# Altium footprint library LimeMicroAltiumLib_pcbLib.PcbLib: 274 footprints (part 1 of 18)
Each footprint in its own frame and in the unit in brackets; x right, y up, seen from the top. Pads: shape width x height; smd on the part's side, far side on the other; paste and mask are expansions set on the pad; w line width, h text height; cw(c..) or ccw(c..) is an arc to the next point about the centre after c.
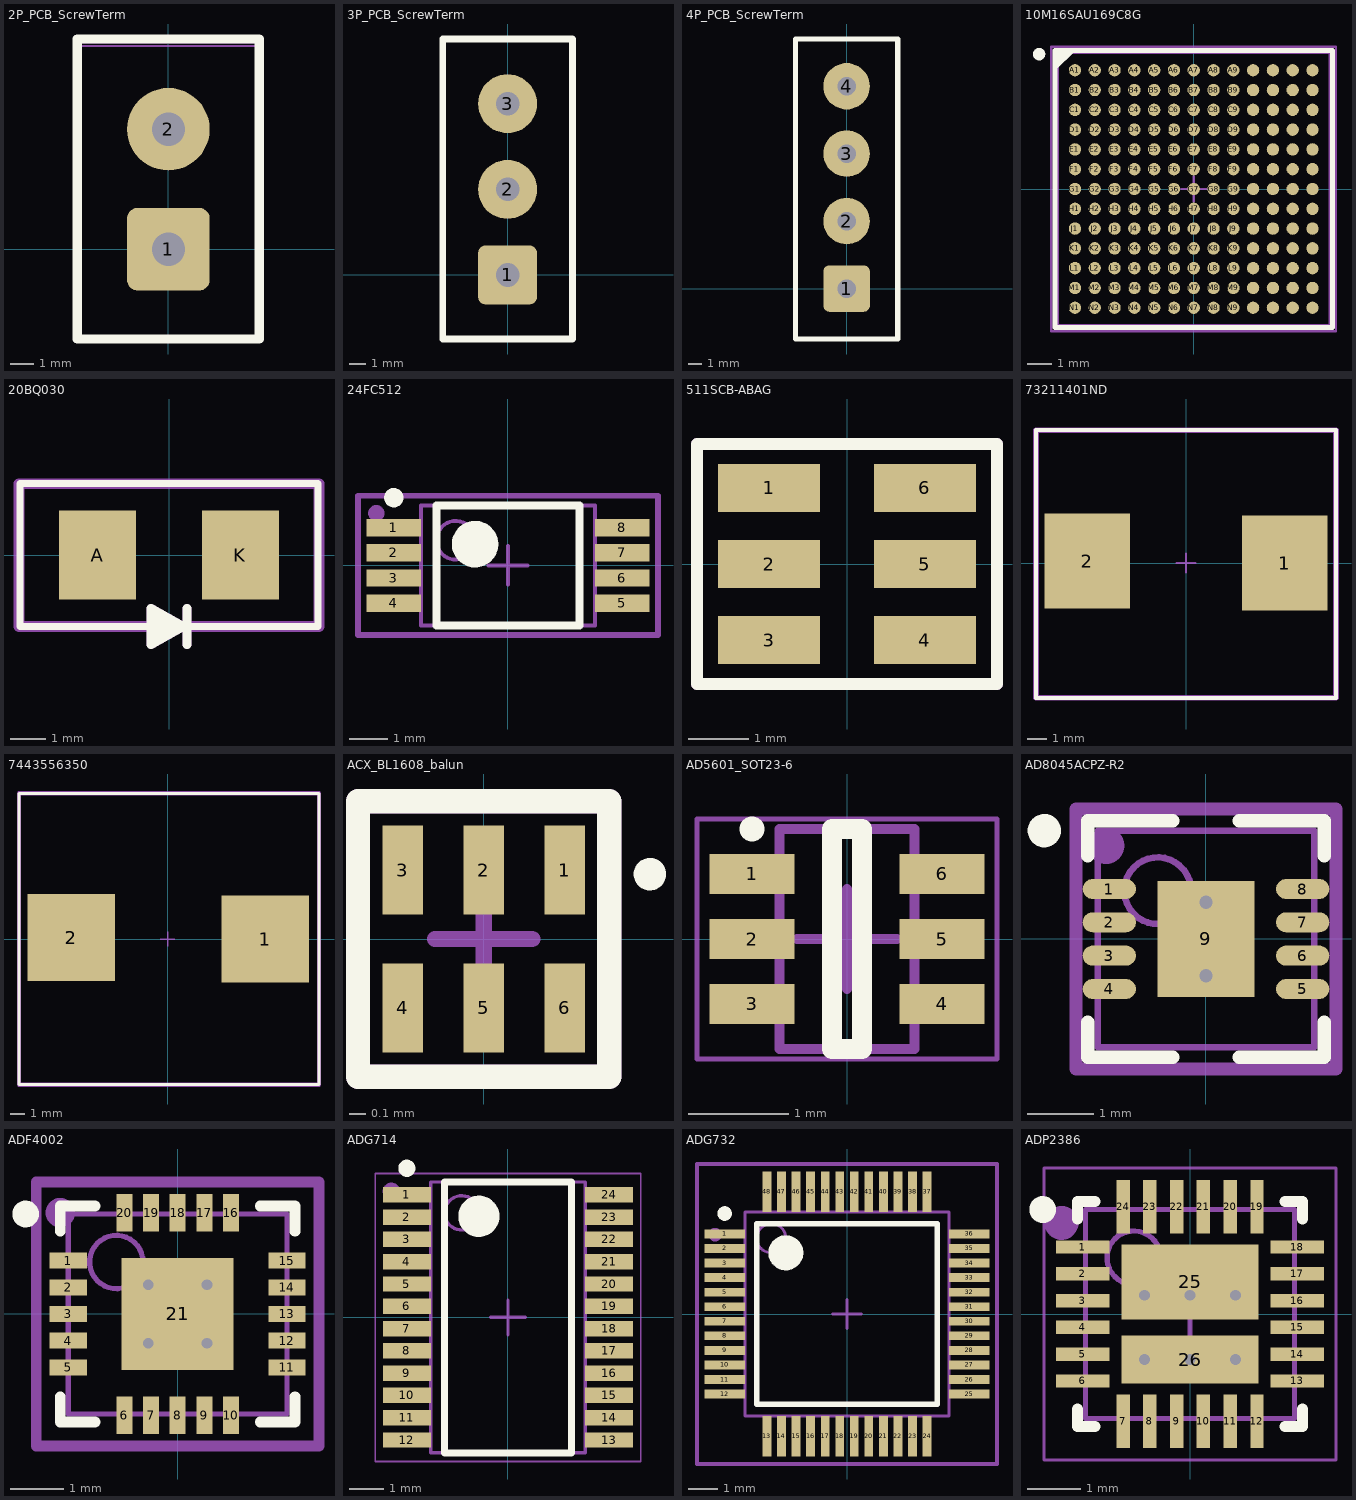
[diagram p0: the footprints below, top view; thin cyan lines are the x and y axes]

## 2P_PCB_ScrewTerm [mm] "TERM BLOCK 2POS SIDE"
height 8.5
pads (2):
  rrect25% 3.5x3.5 hole 1.4: 1(0,0)
  round 3.5 hole 1.4: 2(0,5.08)
Top Overlay:
  lines w0.4: -3.85,-3.8 3.85,-3.8 3.85,8.9 -3.85,8.9 -3.85,-3.8
Mechanical 13:
  lines w0.076: -3.85,-3.8 3.8,-3.8 3.8,8.6 -3.85,8.6 -3.85,-3.8
Mechanical 15:
  lines w0.2: 3.4,-3.8 -3.8,-3.8 -3.8,8.8 3.9,8.8 3.9,-3.8
  text ".designator" at -0.1,2.5 h1.2
3D body "terminal_blocks_a-tb500vj02h.stp": height 19, standoff -4, extent -5.503,-3.098 5,8.098

## 3P_PCB_ScrewTerm [mm] "TERM BLOCK 3POS SIDE"
height 8.5
pads (3):
  rrect25% 3.5x3.5 hole 1.4: 1(0,0)
  round 3.5 hole 1.4: 2(0,5.08) 3(0,10.16)
Top Overlay:
  lines w0.4: -3.85,-3.8 3.85,-3.8 3.85,14 -3.85,14 -3.85,-3.8
Mechanical 13:
  lines w0.076: -3.85,-3.8 3.8,-3.8 3.8,14 -3.85,14 -3.85,-3.8
Mechanical 15:
  lines w0.2: -3.4,13.96 3.8,13.96 ; 3.4,-3.8 -3.8,-3.8 -3.8,14 3.9,14 3.9,-3.8
  text ".designator" at -0.1,2.5 h1.2
3D body "terminal_blocks_a-tb500vj02h.stp": height 19, standoff -4, extent -5.503,1.982 5,13.178
3D body "terminal_blocks_a-tb500vj02h.stp": height 19, standoff -4, extent -5.503,-3.098 5,8.098

## 4P_PCB_ScrewTerm [mm] "TERM BLOCK 10POS SIDE ENT 3.81MM"
height 8.5
pads (4):
  rrect25% 3.5x3.5 hole 1.4: 1(0,0)
  round 3.5 hole 1.4: 2(0,5.08) 3(0,10.16) 4(0,15.24)
Top Overlay:
  lines w0.4: -3.85,-3.8 3.85,-3.8 3.85,18.8 -3.85,18.8 -3.85,-3.8
Mechanical 13:
  lines w0.076: -3.85,-3.8 3.8,-3.8 3.8,18.8 -3.85,18.8 -3.85,-3.8
Mechanical 15:
  lines w0.2: 3.4,-3.8 -3.8,-3.8 -3.8,18.8 3.9,18.8 3.9,-3.8
  text ".designator" at -0.1,7.6 h1.2
3D body "terminal_blocks_a-tb500vj02h.stp": height 19, standoff -4, extent -5.503,-2.998 5,8.198
3D body "terminal_blocks_a-tb500vj02h.stp": height 19, standoff -4, extent -5.503,6.962 5,18.158

## 10M16SAU169C8G [mm] "BGA, 169-Leads, Body 11,00x11,00mmx1,55mm, Pitch 0,80mm"
height 1.55
pads (169):
  round 0.5 smd mask+0.02: A1(-4.8,4.8) A2(-4,4.8) A3(-3.2,4.8) A4(-2.4,4.8) A5(-1.6,4.8) A6(-0.8,4.8) A7(0,4.8) A8(0.8,4.8) A9(1.6,4.8) A10(2.4,4.8) A11(3.2,4.8) A12(4,4.8) A13(4.8,4.8) B1(-4.8,4) B2(-4,4) B3(-3.2,4) B4(-2.4,4) B5(-1.6,4) B6(-0.8,4) B7(0,4) B8(0.8,4) B9(1.6,4) B10(2.4,4) B11(3.2,4) B12(4,4) B13(4.8,4) C1(-4.8,3.2) C2(-4,3.2) C3(-3.2,3.2) C4(-2.4,3.2) C5(-1.6,3.2) C6(-0.8,3.2) C7(0,3.2) C8(0.8,3.2) C9(1.6,3.2) C10(2.4,3.2) C11(3.2,3.2) C12(4,3.2) C13(4.8,3.2) D1(-4.8,2.4) D2(-4,2.4) D3(-3.2,2.4) D4(-2.4,2.4) D5(-1.6,2.4) D6(-0.8,2.4) D7(0,2.4) D8(0.8,2.4) D9(1.6,2.4) D10(2.4,2.4) D11(3.2,2.4) D12(4,2.4) D13(4.8,2.4) E1(-4.8,1.6) E2(-4,1.6) E3(-3.2,1.6) E4(-2.4,1.6) E5(-1.6,1.6) E6(-0.8,1.6) E7(0,1.6) E8(0.8,1.6) E9(1.6,1.6) E10(2.4,1.6) E11(3.2,1.6) E12(4,1.6) E13(4.8,1.6) F1(-4.8,0.8) F2(-4,0.8) F3(-3.2,0.8) F4(-2.4,0.8) F5(-1.6,0.8) F6(-0.8,0.8) F7(0,0.8) F8(0.8,0.8) F9(1.6,0.8) F10(2.4,0.8) F11(3.2,0.8) F12(4,0.8) F13(4.8,0.8) G1(-4.8,0) G2(-4,0) G3(-3.2,0) G4(-2.4,0) G5(-1.6,0) G6(-0.8,0) G7(0,0) G8(0.8,0) G9(1.6,0) G10(2.4,0) G11(3.2,0) G12(4,0) G13(4.8,0) H1(-4.8,-0.8) H2(-4,-0.8) H3(-3.2,-0.8) H4(-2.4,-0.8) H5(-1.6,-0.8) H6(-0.8,-0.8) H7(0,-0.8) H8(0.8,-0.8) H9(1.6,-0.8) H10(2.4,-0.8) H11(3.2,-0.8) H12(4,-0.8) H13(4.8,-0.8) J1(-4.8,-1.6) J2(-4,-1.6) J3(-3.2,-1.6) J4(-2.4,-1.6) J5(-1.6,-1.6) J6(-0.8,-1.6) J7(0,-1.6) J8(0.8,-1.6) J9(1.6,-1.6) J10(2.4,-1.6) J11(3.2,-1.6) J12(4,-1.6) J13(4.8,-1.6) K1(-4.8,-2.4) K2(-4,-2.4) K3(-3.2,-2.4) K4(-2.4,-2.4) K5(-1.6,-2.4) K6(-0.8,-2.4) K7(0,-2.4) K8(0.8,-2.4) K9(1.6,-2.4) K10(2.4,-2.4) K11(3.2,-2.4) K12(4,-2.4) K13(4.8,-2.4) L1(-4.8,-3.2) L2(-4,-3.2) L3(-3.2,-3.2) L4(-2.4,-3.2) L5(-1.6,-3.2) L6(-0.8,-3.2) L7(0,-3.2) L8(0.8,-3.2) L9(1.6,-3.2) L10(2.4,-3.2) L11(3.2,-3.2) L12(4,-3.2) L13(4.8,-3.2) M1(-4.8,-4) M2(-4,-4) M3(-3.2,-4) M4(-2.4,-4) M5(-1.6,-4) M6(-0.8,-4) M7(0,-4) M8(0.8,-4) M9(1.6,-4) M10(2.4,-4) M11(3.2,-4) M12(4,-4) M13(4.8,-4) N1(-4.8,-4.8) N2(-4,-4.8) N3(-3.2,-4.8) N4(-2.4,-4.8) N5(-1.6,-4.8) N6(-0.8,-4.8) N7(0,-4.8) N8(0.8,-4.8) N9(1.6,-4.8) N10(2.4,-4.8) N11(3.2,-4.8) N12(4,-4.8) N13(4.8,-4.8)
Top Overlay:
  circle w0.25: c-6.25,5.45 r0.125
  region: -4.919,5.6 -5.6,4.919 -5.6,5.6
  lines w0.2: -5.6,4.919 -4.919,5.6 ; -5.6,-5.6 5.6,-5.6 5.6,5.6 -5.6,5.6 -5.6,-5.6
Mechanical 13:
  lines w0.1: -5.5,-5.5 5.5,-5.5 5.5,5.5 -5.5,5.5 -5.5,-5.5
Mechanical 15:
  circle w0.2: c-4.8,4.8 r0.1
  lines w0.1: -0.5,0 0.5,0 ; 0,-0.5 0,0.5 ; -5.75,-5.75 5.75,-5.75 5.75,5.75 -5.75,5.75 -5.75,-5.75
  text ".Designator" at 0,0 h0.55
3D body: height 1.65, standoff 1.55, extent -5.2,4.4 -4.4,5.2
3D body: height 1.55, standoff 0, extent -5.5,-5.5 5.5,5.5

## 20BQ030 [mm]
pads (2):
  rect 2.15x2.5 smd: A(-2,0) K(2,0)
Top Overlay:
  lines w0.2: -4.175,-2 4.175,-2 4.175,2 -4.175,2 -4.175,0 -4.175,-2
  lines w0.254: -0.5,-2.2 -0.1,-2.2 ; -0.5,-2 -0.3,-2 0.4,-2 ; -0.5,-1.8 0,-1.8 ; 0.5,-2.5 0.5,-1.5 ; 0.4,-2 -0.5,-2.5 -0.5,-1.5 0.4,-2
Mechanical 15:
  lines w0.254: -0.5,-2.2 -0.1,-2.2 ; -0.5,-2 -0.3,-2 0.4,-2 ; -0.5,-1.8 0,-1.8 ; 0.5,-2.5 0.5,-1.5 ; 0.4,-2 -0.5,-1.5 -0.5,-2.5 0.4,-2
  lines w0.3: -4.2,-2 4.2,-2 4.2,2 -4.2,2 -4.2,-2
  text ".Designator" at 0,0 h0.7

## 24FC512 [mm] "TSOP, 8-Leads, Body 3,00x4,40mm, Pitch 0,65mm, IPC Medium Density"
height 1.2
pads (8):
  rect 1.4x0.45 smd mask+0.05: 1(-2.95,0.975) 2(-2.95,0.325) 3(-2.95,-0.325) 4(-2.95,-0.975) 5(2.95,-0.975) 6(2.95,-0.325) 7(2.95,0.325) 8(2.95,0.975)
Top Overlay:
  circle w0.6: c-0.85,0.55 r0.3
  circle w0.25: c-2.95,1.75 r0.125
  lines w0.2: -1.85,-1.55 1.85,-1.55 1.85,1.55 -1.85,1.55 -1.85,-1.55
Mechanical 13:
  circle w0.1: c-1.35,0.65 r0.5
  lines w0.1: -2.25,-1.55 2.25,-1.55 2.25,1.55 -2.25,1.55 -2.25,-1.55
Mechanical 15:
  circle w0.35: c-3.4,1.35 r0.035
  lines w0.1: -0.5,0 0.5,0 ; 0,-0.5 0,0.5
  lines w0.15: -3.875,-1.8 3.875,-1.8 3.875,1.8 -3.875,1.8 -3.875,-1.8
  text ".Designator" at 0,0 h0.7
3D body "TSSOP-8.STEP": height 1.19, standoff -0.01, extent -3.25,-1.55 3.25,1.55

## 511SCB-ABAG [mm]
pads (6):
  rect 1.7x0.8 smd: 1(-1.3,1.27) 2(-1.3,0) 3(-1.3,-1.27) 4(1.3,-1.27) 5(1.3,0) 6(1.3,1.27)
Top Overlay:
  lines w0.2: -2.5,-2 -2.5,2 2.5,2 2.5,-2 -2.5,-2
Mechanical 15:
  lines w0.2: -2.5,-2 -2.5,2 2.5,2 2.5,-2 -2.5,-2
  text ".designator" at 0,0 h0.7
3D body: height 1, standoff 0, extent -1.75,-1.8 1.75,1.8

## 73211401ND [mm]
pads (2):
  rect 4.5x5 smd: 1(5.2,0) 2(-5.2,0.1)
Top Overlay:
  lines w0.2: -7.9,-7.1 -7.9,7 7.9,7 7.9,-7.1 -7.9,-7.1
Mechanical 15:
  lines w0.1: -0.5,0 0.5,0 ; 0,-0.5 0,0.5
  lines w0.3: -7.9,-7.1 -7.9,7 7.9,7 7.9,-7.1 -7.9,-7.1
  text ".Designator" at 0,0 h0.7
3D body: height 6.5, standoff 0, extent -6.4,-6.4 6.4,6.4

## 7443556350 [mm]
pads (2):
  rect 6x6 smd: 1(6.7,0) 2(-6.6,0.1)
Top Overlay:
  lines w0.2: -10.2,-10 10.4,-10 10.4,10 -10.2,10 -10.2,-10
Mechanical 15:
  lines w0.1: -0.5,0 0.5,0 ; 0,-0.5 0,0.5
  lines w0.3: -10.2,-10 10.4,-10 10.4,10 -10.2,10 -10.2,-10
  text ".Designator" at 0,0 h0.7
3D body: height 9, standoff 0, extent -9.1,-9.1 9.1,9.1

## ACX_BL1608_balun [mm]
pads (6):
  rect 0.25x0.55 smd mask+0.05: 1(0.5,0.425) 2(0,0.425) 3(-0.5,0.425) 4(-0.5,-0.425) 5(0,-0.425) 6(0.5,-0.425)
Top Overlay:
  circle w0.1: c1.025,0.4 r0.05
  lines w0.15: -0.775,-0.85 -0.775,0.85 0.775,0.85 0.775,-0.85 -0.775,-0.85
Mechanical 15:
  circle w0.1: c0.5,0.475 r0.05
  lines w0.1: -0.3,0 0,0 ; 0,-0.3 0,0 ; 0,0.3 0,0 ; 0.3,0 0,0
  lines w0.15: -0.775,-0.85 0.775,-0.85 0.775,0.85 -0.775,0.85 -0.775,-0.85
  text ".Designator" at 0,0 h0.55
3D body: height 0.6, standoff 0, extent -0.8,-0.4 0.8,0.4
3D body: height 0.6, standoff 0, extent -0.6,-0.425 -0.4,-0.275
3D body: height 0.6, standoff 0, extent -0.1,-0.425 0.1,-0.275
3D body: height 0.6, standoff 0, extent 0.4,-0.425 0.6,-0.275
3D body: height 0.6, standoff 0, extent 0.4,0.275 0.6,0.425
3D body: height 0.6, standoff 0, extent -0.1,0.275 0.1,0.425
3D body: height 0.6, standoff 0, extent -0.6,0.275 -0.4,0.425
3D body: height 0.6, standoff 0, extent 0.4,-0.075 0.6,0.15

## AD5601_SOT23-6 [mm] "SOT23, 6-Leads, Body 2x1.3mm, Pitch 0.65mm, Lead Span 2.1mm, IPC Medium Density"
height 1.1
pads (6):
  rect 0.85x0.4 smd mask+0.05: 1(-0.95,0.65) 2(-0.95,0) 3(-0.95,-0.65) 4(0.95,-0.65) 5(0.95,0) 6(0.95,0.65)
Top Overlay:
  circle w0.25: c-0.95,1.1 r0
  lines w0.2: -0.15,-1.1 -0.15,1.1 0.15,1.1 0.15,-1.1 -0.15,-1.1
Mechanical 13:
  lines w0.1: -0.675,-1.1 0.675,-1.1 0.675,1.1 -0.675,1.1 -0.675,-1.1
Mechanical 15:
  circle w0.15: c-1,0.7 r0.056
  lines w0.05: -1.5,-1.2 1.5,-1.2 1.5,1.2 -1.5,1.2 -1.5,-1.2
  lines w0.1: -0.5,0 0.5,0 ; 0,-0.5 0,0.5
  text ".Designator" at 0,0 h0.55
3D body "User Library-SC70-6.step": height 0.43, standoff -0.53, extent -1.05,-1 1.05,1

## AD8045ACPZ-R2 [mm] "QFN, 8-Leads, Body 3x3mm, Pitch 0.5mm, Thermal Pad 1.45X1.74mm, IPC High Density"
height 0.9
pads (9):
  oval 0.8x0.3 smd mask+0.05: 1(-1.45,0.75) 2(-1.45,0.25) 3(-1.45,-0.25) 4(-1.45,-0.75) 5(1.45,-0.75) 6(1.45,-0.25) 7(1.45,0.25) 8(1.45,0.75)
  rect 1.45x1.74 smd: 9(0,0)
via 0,0.55 diameter 0.5 hole 0.2
via 0,-0.55 diameter 0.5 hole 0.2
Top Overlay:
  circle w0.25: c-2.425,1.625 r0.125
  lines w0.2: -1.775,-1.25 -1.775,-1.775 -0.5,-1.775 ; -1.775,1.25 -1.775,1.775 -0.5,1.775 ; 0.5,-1.775 1.775,-1.775 1.775,-1.25 ; 0.5,1.775 1.775,1.775 1.775,1.25
Mechanical 13:
  circle w0.1: c-0.725,0.725 r0.5
  lines w0.1: -1.625,-1.625 -1.625,1.625 1.625,1.625 1.625,-1.625 -1.625,-1.625
Mechanical 15:
  circle w0.35: c-1.5,1.4 r0.1
  lines w0.1: -0.5,0 0.5,0 ; 0,-0.5 0,0.5
  lines w0.2: -1.95,-1.95 -1.95,1.95 1.95,1.95 1.95,-1.95 -1.95,-1.95
  text ".Designator" at 0,0 h0.7
3D body "User Library-AD8137 lfcsp.step": height 0.9, standoff -0.04, extent -1.476,-1.5 1.526,1.5

## ADF4002 [mm]
height 0.85
pads (21):
  rect 0.7x0.3 smd mask+0.05: 1(-2.05,1) 2(-2.05,0.5) 3(-2.05,0) 4(-2.05,-0.5) 5(-2.05,-1) 11(2.05,-1) 12(2.05,-0.5) 13(2.05,0) 14(2.05,0.5) 15(2.05,1)
  rect 0.3x0.7 smd mask+0.05: 6(-1,-1.9) 7(-0.5,-1.9) 8(0,-1.9) 9(0.5,-1.9) 10(1,-1.9) 16(1,1.9) 17(0.5,1.9) 18(0,1.9) 19(-0.5,1.9) 20(-1,1.9)
  rect 2.1x2.1 smd: 21(0,0)
via -0.55,0.55 diameter 0.5 hole 0.2
via 0.55,0.55 diameter 0.5 hole 0.2
via -0.55,-0.55 diameter 0.5 hole 0.2
via 0.55,-0.55 diameter 0.5 hole 0.2
Top Overlay:
  circle w0.25: c-2.85,1.875 r0.125
  lines w0.2: -2.2,-1.55 -2.2,-2.025 -1.55,-2.025 ; -2.2,1.55 -2.2,2.025 -1.55,2.025 ; 1.55,-2.025 2.2,-2.025 2.2,-1.55 ; 1.55,2.025 2.2,2.025 2.2,1.55
Mechanical 13:
  circle w0.1: c-1.15,0.975 r0.5
  lines w0.1: -2.05,-1.875 -2.05,1.875 2.05,1.875 2.05,-1.875 -2.05,-1.875
Mechanical 15:
  circle w0.35: c-2.2,1.9 r0.1
  lines w0.1: -0.5,0 0.5,0 ; 0,-0.5 0,0.5
  lines w0.2: -2.65,-2.475 -2.65,2.475 2.65,2.475 2.65,-2.475 -2.65,-2.475
  text ".Designator" at 0,0 h0.7
3D body "User Library-QFN4x4_20pins.step": height 0.8, standoff 0, extent -2.025,-2.02 2.015,2.02

## ADG714 [mm] "TSOP, 24-Leads, Body 7,80x4,40mm, Pitch 0,65mm, IPC Medium Density"
height 1.2
pads (24):
  rect 1.4x0.45 smd mask+0.05: 1(-2.95,3.575) 2(-2.95,2.925) 3(-2.95,2.275) 4(-2.95,1.625) 5(-2.95,0.975) 6(-2.95,0.325) 7(-2.95,-0.325) 8(-2.95,-0.975) 9(-2.95,-1.625) 10(-2.95,-2.275) 11(-2.95,-2.925) 12(-2.95,-3.575) 13(2.95,-3.575) 14(2.95,-2.925) 15(2.95,-2.275) 16(2.95,-1.625) 17(2.95,-0.975) 18(2.95,-0.325) 19(2.95,0.325) 20(2.95,0.975) 21(2.95,1.625) 22(2.95,2.275) 23(2.95,2.925) 24(2.95,3.575)
Top Overlay:
  circle w0.6: c-0.85,2.95 r0.3
  circle w0.25: c-2.95,4.35 r0.125
  lines w0.2: -1.85,-3.95 1.85,-3.95 1.85,3.95 -1.85,3.95 -1.85,-3.95
Mechanical 13:
  circle w0.1: c-1.35,3.05 r0.5
  lines w0.1: -2.25,-3.95 2.25,-3.95 2.25,3.95 -2.25,3.95 -2.25,-3.95
Mechanical 15:
  circle w0.35: c-3.4,3.675 r0.079
  lines w0.05: -3.875,-4.2 3.875,-4.2 3.875,4.2 -3.875,4.2 -3.875,-4.2
  lines w0.1: -0.5,0 0.5,0 ; 0,-0.5 0,0.5
  text ".Designator" at 0,0 h0.7
3D body "SOP65P640X110-24N.STEP": height 1.2, standoff 0, extent -3.25,-3.95 3.25,3.95

## ADG732 [mm] "TSQFP, 48-Leads, Body 7,00x7,00mm, Pitch 0,50mm, IPC Medium Density"
height 1
pads (48):
  rect 1.4x0.3 smd mask+0.05: 1(-4.2,2.75) 2(-4.2,2.25) 3(-4.2,1.75) 4(-4.2,1.25) 5(-4.2,0.75) 6(-4.2,0.25) 7(-4.2,-0.25) 8(-4.2,-0.75) 9(-4.2,-1.25) 10(-4.2,-1.75) 11(-4.2,-2.25) 12(-4.2,-2.75) 25(4.2,-2.75) 26(4.2,-2.25) 27(4.2,-1.75) 28(4.2,-1.25) 29(4.2,-0.75) 30(4.2,-0.25) 31(4.2,0.25) 32(4.2,0.75) 33(4.2,1.25) 34(4.2,1.75) 35(4.2,2.25) 36(4.2,2.75)
  rect 0.3x1.4 smd mask+0.05: 13(-2.75,-4.2) 14(-2.25,-4.2) 15(-1.75,-4.2) 16(-1.25,-4.2) 17(-0.75,-4.2) 18(-0.25,-4.2) 19(0.25,-4.2) 20(0.75,-4.2) 21(1.25,-4.2) 22(1.75,-4.2) 23(2.25,-4.2) 24(2.75,-4.2) 37(2.75,4.2) 38(2.25,4.2) 39(1.75,4.2) 40(1.25,4.2) 41(0.75,4.2) 42(0.25,4.2) 43(-0.25,4.2) 44(-0.75,4.2) 45(-1.25,4.2) 46(-1.75,4.2) 47(-2.25,4.2) 48(-2.75,4.2)
Top Overlay:
  circle w0.25: c-4.2,3.45 r0.125
  circle w0.6: c-2.1,2.1 r0.3
  lines w0.2: -3.1,-3.1 -3.1,3.1 3.1,3.1 3.1,-3.1 -3.1,-3.1
Mechanical 13:
  circle w0.1: c-2.6,2.6 r0.5
  lines w0.1: -3.5,-3.5 -3.5,3.5 3.5,3.5 3.5,-3.5 -3.5,-3.5
Mechanical 15:
  circle w0.35: c-4.525,2.725 r0.056
  lines w0.1: -0.5,0 0.5,0 ; 0,-0.5 0,0.5
  lines w0.15: -5.15,-5.15 -5.15,5.15 5.15,5.15 5.15,-5.15 -5.15,-5.15
  text ".Designator" at 0.05,0 h0.7
3D body "User Library-LQFP48.step": height 1.5, standoff 0, extent -4.5,-4.5 4.5,4.5

## ADP2386 [mm] "QFN, 24-Leads, Body 4,00x4,00mm, Pitch 0,50mm, 2x thermal pads, IPC Medium Density"
height 0.8
pads (26):
  rect 1x0.25 smd mask+0.05: 1(-2,1.25) 2(-2,0.75) 3(-2,0.25) 4(-2,-0.25) 5(-2,-0.75) 6(-2,-1.25) 13(2,-1.25) 14(2,-0.75) 15(2,-0.25) 16(2,0.25) 17(2,0.75) 18(2,1.25)
  rect 0.25x1 smd mask+0.05: 7(-1.25,-2) 8(-0.75,-2) 9(-0.25,-2) 10(0.25,-2) 11(0.75,-2) 12(1.25,-2) 19(1.25,2) 20(0.75,2) 21(0.25,2) 22(-0.25,2) 23(-0.75,2) 24(-1.25,2)
  rect 2.55x1.4 smd mask+0.05: 25(0,0.6)
  rect 2.55x0.9 smd mask+0.05: 26(0,-0.85)
via 0,-0.85 diameter 0.5 hole 0.2
via 0.85,-0.85 diameter 0.5 hole 0.2
via -0.85,-0.85 diameter 0.5 hole 0.2
via -0.85,0.35 diameter 0.5 hole 0.2
via 0.85,0.35 diameter 0.5 hole 0.2
via 0,0.35 diameter 0.5 hole 0.2
Top Overlay:
  circle w0.25: c-2.75,1.95 r0.125
  lines w0.2: -2.1,-1.775 -2.1,-2.1 -1.775,-2.1 ; -2.1,1.775 -2.1,2.1 -1.775,2.1 ; 1.775,-2.1 2.1,-2.1 2.1,-1.775 ; 1.775,2.1 2.1,2.1 2.1,1.775
Mechanical 13:
  circle w0.1: c-1.05,1.05 r0.5
  lines w0.1: -1.95,-1.95 -1.95,1.95 1.95,1.95 1.95,-1.95 -1.95,-1.95
Mechanical 15:
  circle w0.35: c-2.4,1.7 r0.141
  lines w0.05: -2.725,-2.725 -2.725,2.725 2.725,2.725 2.725,-2.725 -2.725,-2.725
  lines w0.1: -0.5,0 0.5,0 ; 0,-0.5 0,0.5
  text ".Designator" at 0,0 h0.7
3D body "User Library-QFN24-0_5.STEP": height 1, standoff 0, extent -2,-2 2,2